# Altium footprint library etherceptor.PcbLib: 98 footprints (part 7 of 7)
Each footprint in its own frame and in the unit in brackets; x right, y up, seen from the top. Pads: shape width x height; smd on the part's side, far side on the other; paste and mask are expansions set on the pad; w line width, h text height; cw(c..) or ccw(c..) is an arc to the next point about the centre after c.
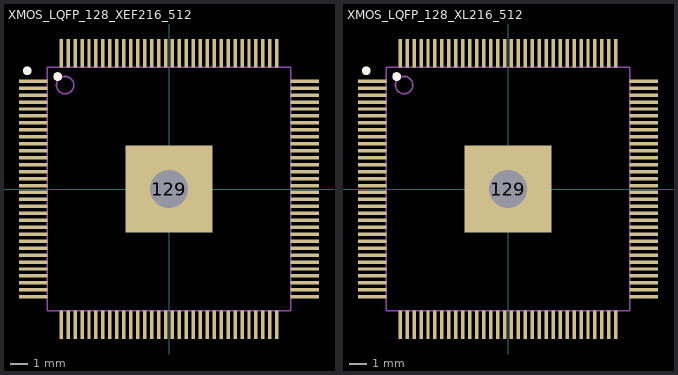
[diagram p6: the footprints below, top view; thin cyan lines are the x and y axes]

## XMOS_LQFP_128_XEF216_512 [mm]
pads (129):
  rect 1.65x0.2 smd: 1(-7.8,6.2) 2(-7.8,5.8) 3(-7.8,5.4) 4(-7.8,5) 5(-7.8,4.6) 6(-7.8,4.2) 7(-7.8,3.8) 8(-7.8,3.4) 9(-7.8,3) 10(-7.8,2.6) 11(-7.8,2.2) 12(-7.8,1.8) 13(-7.8,1.4) 14(-7.8,1) 15(-7.8,0.6) 16(-7.8,0.2) 17(-7.8,-0.2) 18(-7.8,-0.6) 19(-7.8,-1) 20(-7.8,-1.4) 21(-7.8,-1.8) 22(-7.8,-2.2) 23(-7.8,-2.6) 24(-7.8,-3) 25(-7.8,-3.4) 26(-7.8,-3.8) 27(-7.8,-4.2) 28(-7.8,-4.6) 29(-7.8,-5) 30(-7.8,-5.4) 31(-7.8,-5.8) 32(-7.8,-6.2) 65(7.8,-6.2) 66(7.8,-5.8) 67(7.8,-5.4) 68(7.8,-5) 69(7.8,-4.6) 70(7.8,-4.2) 71(7.8,-3.8) 72(7.8,-3.4) 73(7.8,-3) 74(7.8,-2.6) 75(7.8,-2.2) 76(7.8,-1.8) 77(7.8,-1.4) 78(7.8,-1) 79(7.8,-0.6) 80(7.8,-0.2) 81(7.8,0.2) 82(7.8,0.6) 83(7.8,1) 84(7.8,1.4) 85(7.8,1.8) 86(7.8,2.2) 87(7.8,2.6) 88(7.8,3) 89(7.8,3.4) 90(7.8,3.8) 91(7.8,4.2) 92(7.8,4.6) 93(7.8,5) 94(7.8,5.4) 95(7.8,5.8) 96(7.8,6.2)
  rect 0.2x1.65 smd: 33(-6.2,-7.8) 34(-5.8,-7.8) 35(-5.4,-7.8) 36(-5,-7.8) 37(-4.6,-7.8) 38(-4.2,-7.8) 39(-3.8,-7.8) 40(-3.4,-7.8) 41(-3,-7.8) 42(-2.6,-7.8) 43(-2.2,-7.8) 44(-1.8,-7.8) 45(-1.4,-7.8) 46(-1,-7.8) 47(-0.6,-7.8) 48(-0.2,-7.8) 49(0.2,-7.8) 50(0.6,-7.8) 51(1,-7.8) 52(1.4,-7.8) 53(1.8,-7.8) 54(2.2,-7.8) 55(2.6,-7.8) 56(3,-7.8) 57(3.4,-7.8) 58(3.8,-7.8) 59(4.2,-7.8) 60(4.6,-7.8) 61(5,-7.8) 62(5.4,-7.8) 63(5.8,-7.8) 64(6.2,-7.8) 97(6.2,7.8) 98(5.8,7.8) 99(5.4,7.8) 100(5,7.8) 101(4.6,7.8) 102(4.2,7.8) 103(3.8,7.8) 104(3.4,7.8) 105(3,7.8) 106(2.6,7.8) 107(2.2,7.8) 108(1.8,7.8) 109(1.4,7.8) 110(1,7.8) 111(0.6,7.8) 112(0.2,7.8) 113(-0.2,7.8) 114(-0.6,7.8) 115(-1,7.8) 116(-1.4,7.8) 117(-1.8,7.8) 118(-2.2,7.8) 119(-2.6,7.8) 120(-3,7.8) 121(-3.4,7.8) 122(-3.8,7.8) 123(-4.2,7.8) 124(-4.6,7.8) 125(-5,7.8) 126(-5.4,7.8) 127(-5.8,7.8) 128(-6.2,7.8)
  rect 5x5 / inner rect 5x5 / far side rect 3x3 hole 2.2: 129(0,0)
Top Overlay:
  circle w0.25: c-6.4,6.465 r0.125
  circle w0.25: c-8.15,6.8 r0.125
Top Paste:
  region: -0.306,-0.306 -0.305,-0.31 -0.305,-1.89 -0.306,-1.894 -0.31,-1.895 -1.89,-1.895 -1.894,-1.894 -1.895,-1.89 -1.895,-0.31 -1.894,-0.306 -1.89,-0.305 -0.31,-0.305
  region: 1.894,-0.306 1.895,-0.31 1.895,-1.89 1.894,-1.894 1.89,-1.895 0.31,-1.895 0.306,-1.894 0.305,-1.89 0.305,-0.31 0.306,-0.306 0.31,-0.305 1.89,-0.305
  region: -0.306,1.894 -0.305,1.89 -0.305,0.31 -0.306,0.306 -0.31,0.305 -1.89,0.305 -1.894,0.306 -1.895,0.31 -1.895,1.89 -1.894,1.894 -1.89,1.895 -0.31,1.895
  region: 1.894,1.894 1.895,1.89 1.895,0.31 1.894,0.306 1.89,0.305 0.31,0.305 0.306,0.306 0.305,0.31 0.305,1.89 0.306,1.894 0.31,1.895 1.89,1.895
Mechanical 1:
  circle w0.1: c-5.975,5.975 r0.5
  lines w0.1: -7,-7 -7,7 7,7 7,-7 -7,-7
3D body "XEF216.stp": height 1.76, standoff 0, extent -8,-8.022 8.022,8

## XMOS_LQFP_128_XL216_512 [mm]
pads (129):
  rect 1.65x0.2 smd: 1(-7.8,6.2) 2(-7.8,5.8) 3(-7.8,5.4) 4(-7.8,5) 5(-7.8,4.6) 6(-7.8,4.2) 7(-7.8,3.8) 8(-7.8,3.4) 9(-7.8,3) 10(-7.8,2.6) 11(-7.8,2.2) 12(-7.8,1.8) 13(-7.8,1.4) 14(-7.8,1) 15(-7.8,0.6) 16(-7.8,0.2) 17(-7.8,-0.2) 18(-7.8,-0.6) 19(-7.8,-1) 20(-7.8,-1.4) 21(-7.8,-1.8) 22(-7.8,-2.2) 23(-7.8,-2.6) 24(-7.8,-3) 25(-7.8,-3.4) 26(-7.8,-3.8) 27(-7.8,-4.2) 28(-7.8,-4.6) 29(-7.8,-5) 30(-7.8,-5.4) 31(-7.8,-5.8) 32(-7.8,-6.2) 65(7.8,-6.2) 66(7.8,-5.8) 67(7.8,-5.4) 68(7.8,-5) 69(7.8,-4.6) 70(7.8,-4.2) 71(7.8,-3.8) 72(7.8,-3.4) 73(7.8,-3) 74(7.8,-2.6) 75(7.8,-2.2) 76(7.8,-1.8) 77(7.8,-1.4) 78(7.8,-1) 79(7.8,-0.6) 80(7.8,-0.2) 81(7.8,0.2) 82(7.8,0.6) 83(7.8,1) 84(7.8,1.4) 85(7.8,1.8) 86(7.8,2.2) 87(7.8,2.6) 88(7.8,3) 89(7.8,3.4) 90(7.8,3.8) 91(7.8,4.2) 92(7.8,4.6) 93(7.8,5) 94(7.8,5.4) 95(7.8,5.8) 96(7.8,6.2)
  rect 0.2x1.65 smd: 33(-6.2,-7.8) 34(-5.8,-7.8) 35(-5.4,-7.8) 36(-5,-7.8) 37(-4.6,-7.8) 38(-4.2,-7.8) 39(-3.8,-7.8) 40(-3.4,-7.8) 41(-3,-7.8) 42(-2.6,-7.8) 43(-2.2,-7.8) 44(-1.8,-7.8) 45(-1.4,-7.8) 46(-1,-7.8) 47(-0.6,-7.8) 48(-0.2,-7.8) 49(0.2,-7.8) 50(0.6,-7.8) 51(1,-7.8) 52(1.4,-7.8) 53(1.8,-7.8) 54(2.2,-7.8) 55(2.6,-7.8) 56(3,-7.8) 57(3.4,-7.8) 58(3.8,-7.8) 59(4.2,-7.8) 60(4.6,-7.8) 61(5,-7.8) 62(5.4,-7.8) 63(5.8,-7.8) 64(6.2,-7.8) 97(6.2,7.8) 98(5.8,7.8) 99(5.4,7.8) 100(5,7.8) 101(4.6,7.8) 102(4.2,7.8) 103(3.8,7.8) 104(3.4,7.8) 105(3,7.8) 106(2.6,7.8) 107(2.2,7.8) 108(1.8,7.8) 109(1.4,7.8) 110(1,7.8) 111(0.6,7.8) 112(0.2,7.8) 113(-0.2,7.8) 114(-0.6,7.8) 115(-1,7.8) 116(-1.4,7.8) 117(-1.8,7.8) 118(-2.2,7.8) 119(-2.6,7.8) 120(-3,7.8) 121(-3.4,7.8) 122(-3.8,7.8) 123(-4.2,7.8) 124(-4.6,7.8) 125(-5,7.8) 126(-5.4,7.8) 127(-5.8,7.8) 128(-6.2,7.8)
  rect 5x5 / inner rect 5x5 / far side rect 3x3 hole 2.2: 129(0,0)
Top Overlay:
  circle w0.25: c-8.15,6.8 r0.125
  circle w0.25: c-6.4,6.465 r0.125
Top Paste:
  region: 1.894,1.894 1.895,1.89 1.895,0.31 1.894,0.306 1.89,0.305 0.31,0.305 0.306,0.306 0.305,0.31 0.305,1.89 0.306,1.894 0.31,1.895 1.89,1.895
  region: -0.306,1.894 -0.305,1.89 -0.305,0.31 -0.306,0.306 -0.31,0.305 -1.89,0.305 -1.894,0.306 -1.895,0.31 -1.895,1.89 -1.894,1.894 -1.89,1.895 -0.31,1.895
  region: 1.894,-0.306 1.895,-0.31 1.895,-1.89 1.894,-1.894 1.89,-1.895 0.31,-1.895 0.306,-1.894 0.305,-1.89 0.305,-0.31 0.306,-0.306 0.31,-0.305 1.89,-0.305
  region: -0.306,-0.306 -0.305,-0.31 -0.305,-1.89 -0.306,-1.894 -0.31,-1.895 -1.89,-1.895 -1.894,-1.894 -1.895,-1.89 -1.895,-0.31 -1.894,-0.306 -1.89,-0.305 -0.31,-0.305
Mechanical 1:
  circle w0.1: c-5.975,5.975 r0.5
  lines w0.1: -7,-7 7,-7 7,7 -7,7 -7,-7
3D body "XMOS-XL216-TQFP128.stp": height 1.75, standoff 0, extent -8.011,-8.011 8.011,8.011